# Altium footprint library HW_HOLLAND_NCDM_MONITOR_R1.PcbLib: 472 footprints (part 10 of 30)
Each footprint in its own frame and in the unit in brackets; x right, y up, seen from the top. Pads: shape width x height; smd on the part's side, far side on the other; paste and mask are expansions set on the pad; w line width, h text height; cw(c..) or ccw(c..) is an arc to the next point about the centre after c.
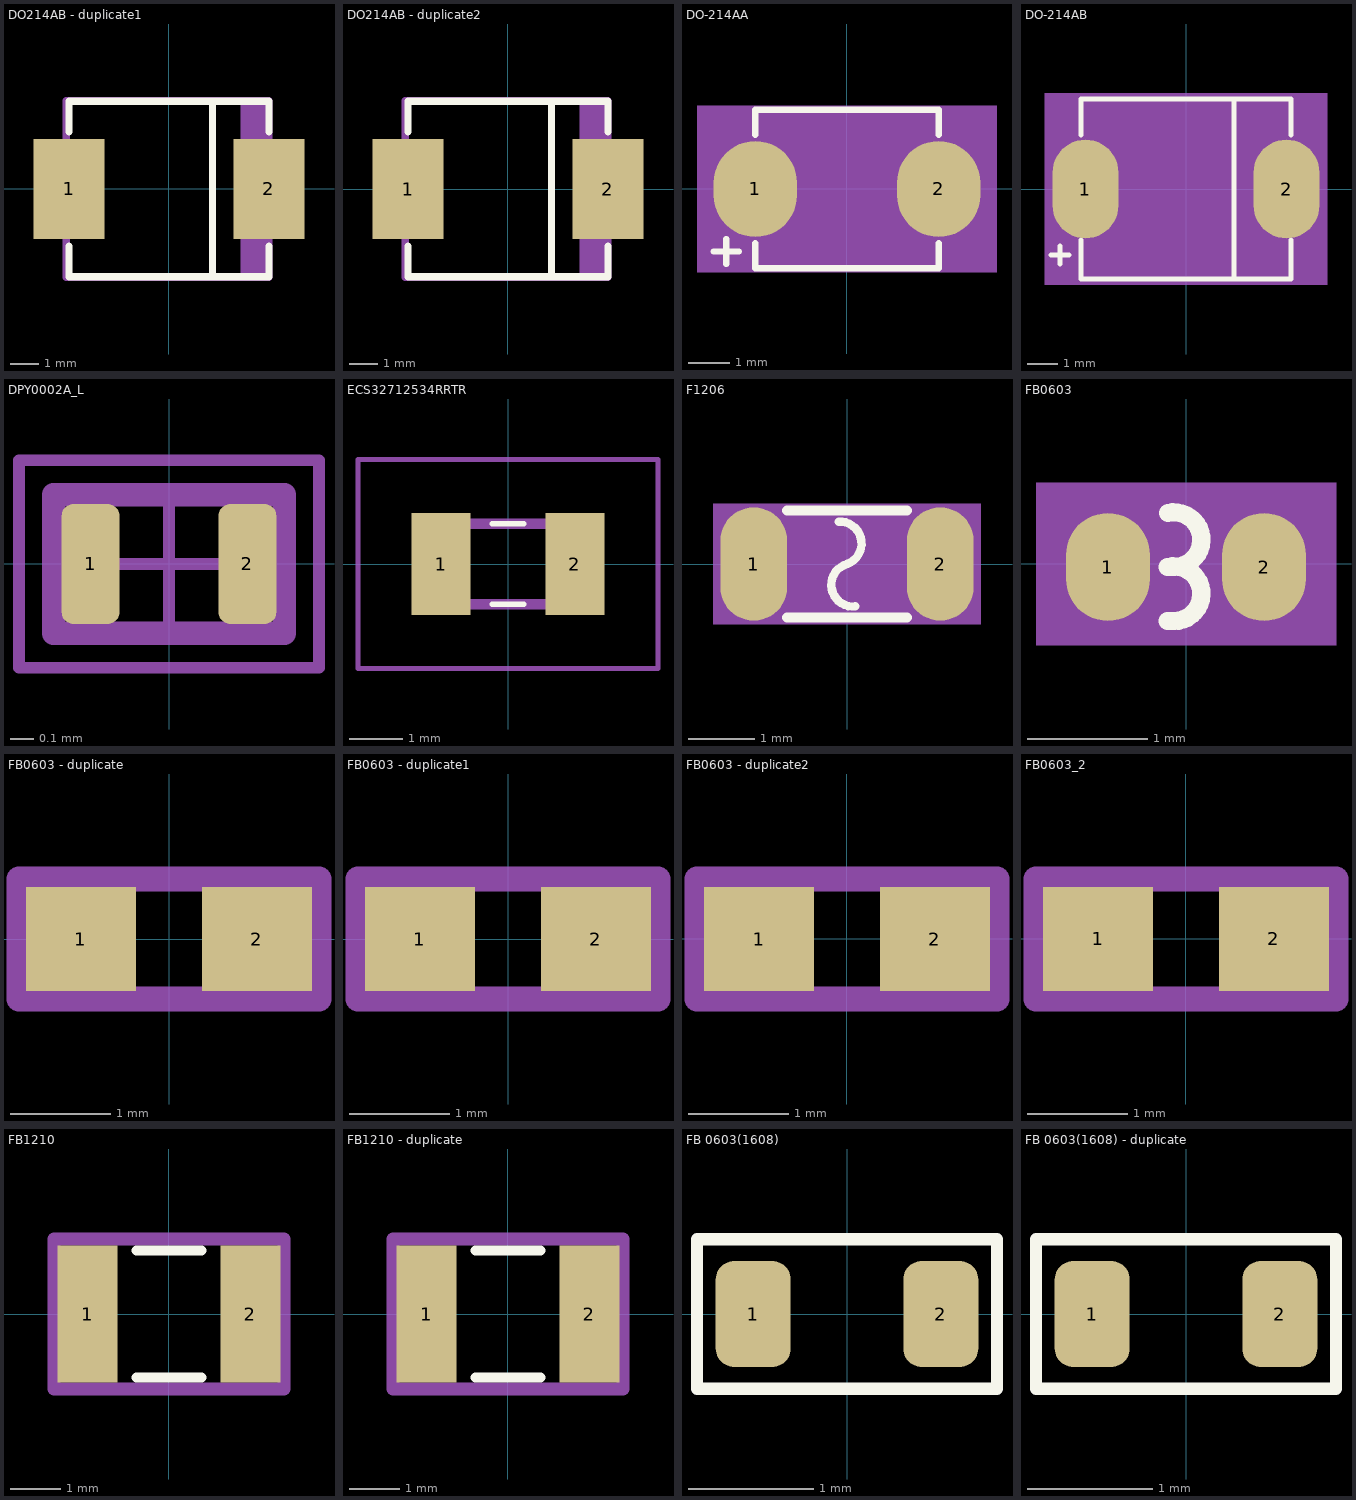
[diagram p9: the footprints below, top view; thin cyan lines are the x and y axes]

## DO214AB - duplicate1 [mm]
pads (2):
  rect 2.5x3.5 smd: 1(-3.5,0) 2(3.5,0)
Top Overlay:
  lines w0.254: -3.5,-3.075 3.5,-3.075 ; -3.5,-3 -3.5,-2 ; -3.5,2 -3.5,3.075 3.5,3.075 3.5,2 ; 1.524,-3 1.524,3 ; 3.5,-3 3.5,-2
Top Designator:
  region: 3.5,3.1 2.5,3.1 2.5,-3.1 3.5,-3.1
  lines w0.254: -3.6,-3.1 -3.6,3.1 3.5,3.1 3.5,-3.1 -3.6,-3.1
  text ".Designator" at -2.812,-0.282 h1.25
3D body "DO-214AB.stp": height 2.65, standoff 0, extent -4.027,-3.125 4.123,3.125

## DO214AB - duplicate2 [mm]
height 0.52
pads (2):
  rect 2.5x3.5 smd: 1(-3.5,0) 2(3.5,0)
Top Overlay:
  lines w0.254: -3.5,-3.075 3.5,-3.075 ; -3.5,-3 -3.5,-2 ; -3.5,2 -3.5,3.075 3.5,3.075 3.5,2 ; 1.524,-3 1.524,3 ; 3.5,-3 3.5,-2
Top Designator:
  region: 3.5,3.101 2.5,3.101 2.5,-3.099 3.5,-3.099
  lines w0.254: -3.6,-3.1 -3.6,3.1 3.5,3.1 3.5,-3.1 -3.6,-3.1
  text ".Designator" at -7.618,-0.508 h1.52
3D body "DO-214AB.stp": height 2.65, standoff 0, extent -4.027,-3.125 4.123,3.125

## DO-214AA [mm]
pads (2):
  oval 2x2.3 smd: 1(-2.2,0) 2(2.2,0)
Top Overlay:
  lines w0.152: -3.2,-1.5 -2.6,-1.5 ; -2.9,-1.8 -2.9,-1.2 ; -2.2,-1.3 -2.2,-1.9 2.2,-1.9 2.2,-1.3 ; -2.2,1.3 -2.2,1.9 2.2,1.9 2.2,1.3
  text ".Designator" at 0.953,0.212 h0.64
Top Assembly:
  lines w0.025: -2.2,-1.9 -2.2,1.9 2.2,1.9 2.2,-1.9 -2.2,-1.9
  lines w0.152: -3.2,-1.5 -2.6,-1.5 ; -2.9,-1.8 -2.9,-1.2
Top 3D Body:
  region: -3.6,2 3.6,2 3.6,-2 -3.6,-2
Mechanical 17:
  text "2" at 2.2,-0.711 h0.89
  text "1" at -2.2,-0.711 h0.89
3D body: height 3.81, standoff 0, extent -3.6,-2 3.6,2

## DO-214AB [mm]
pads (2):
  oval 2.2x3.3 smd: 1(-3.35,0) 2(3.35,0)
Top Overlay:
  lines w0.152: -4.5,-2.2 -3.9,-2.2 ; -4.2,-2.5 -4.2,-1.9 ; -3.5,-1.7 -3.5,-3 3.5,-3 3.5,-1.7 ; -3.5,1.8 -3.5,3 3.5,3 3.5,1.8 ; 1.6,-2.9 1.6,2.9
  text ".Designator" at 0.635,0.211 h0.64
Top Assembly:
  lines w0.025: -3.5,-3 -3.5,3 3.5,3 3.5,-3 -3.5,-3
  lines w0.152: -4.5,-2.2 -3.9,-2.2 ; -4.2,-2.5 -4.2,-1.9
Top 3D Body:
  region: -4.7,3.2 -4.7,-3.2 4.7,-3.2 4.7,3.2
Mechanical 17:
  text "2" at 3.554,-0.1 h0.64
  text "1" at -3.146,-0.1 h0.64
3D body: height 3.81, standoff 0, extent -4.7,-3.2 4.7,3.2

## DPY0002A_L [mm]
height 0.52
pads (2):
  rrect40% 0.25x0.52 smd: 1(-0.34,0) 2(0.34,0)
Mechanical 13:
  lines w0.1: -0.5,-0.3 -0.5,0.3 0.5,0.3 0.5,-0.3 -0.5,-0.3
Mechanical 15:
  lines w0.05: -0.3,0 0.3,0 ; 0,-0.3 0,0.3 ; -0.65,-0.45 -0.65,0.45 0.65,0.45 0.65,-0.45 -0.65,-0.45
3D body: height 0.4, standoff 0, extent -0.5,-0.3 0.5,0.3

## ECS32712534RRTR [mm]
pads (2):
  rect 1.1x1.9 smd: 1(-1.25,0) 2(1.25,0)
Top Overlay:
  lines w0.1: -0.3,-0.75 0.3,-0.75 ; -0.3,0.75 0.3,0.75
Mechanical 13:
  lines w0.2: -1.6,-0.75 1.6,-0.75 1.6,0.75 -1.6,0.75 -1.6,-0.75
Mechanical 15:
  lines w0.1: -2.8,-1.95 2.8,-1.95 2.8,1.95 -2.8,1.95 -2.8,-1.95
3D body "ECS-.327-12.5-34R-TR.STEP": height 0.91, standoff 0.01, extent -1.6,-0.75 1.6,0.75

## F1206 [mm]
pads (2):
  oval 1x1.7 smd: 1(-1.397,0) 2(1.397,0)
Top Overlay:
  lines w0.127: -0.127,0.635 cw(c-0.109,0.308) 0,0 ccw(c0.09,-0.312) 0.127,-0.635
  lines w0.152: -0.9,-0.8 0.9,-0.8 ; -0.9,0.8 0.9,0.8
  text ".Designator" at -0.635,-0.212 h0.64
Top Assembly:
  lines w0.025: -1.6,-0.8 1.6,-0.8 1.6,0.8 -1.6,0.8 -1.6,-0.8
Top 3D Body:
  region: -2,0.9 2,0.9 2,-0.9 -2,-0.9
Mechanical 17:
  text "2" at 1.397,0.356 h0.89
  text "1" at -1.397,0.356 h0.89
3D body: height 3.81, standoff 0, extent -2,-0.9 2,0.9

## FB0603 [mm]
pads (2):
  oval 0.7x0.9 smd: 1(-0.65,-0.025) 2(0.65,-0.025)
Top Overlay:
  lines w0.152: -0.155,-0.475 -0.1,-0.475 ccw(c-0.1,-0.247) -0.15,-0.025 ; -0.155,-0.025 -0.1,-0.025 ccw(c-0.1,0.203) -0.15,0.425
Top Assembly:
  lines w0.025: -0.8,-0.425 0.8,-0.425 0.8,0.375 -0.8,0.375 -0.8,-0.425
Top 3D Body:
  region: -1.25,0.675 1.25,0.675 1.25,-0.675 -1.25,-0.675
Mechanical 17:
  text "1" at -0.142,-0.025 h1.27
  text "2" at 1.158,-0.025 h1.27
3D body: height 3.81, standoff 0, extent -1.25,-0.675 1.25,0.675

## FB0603 - duplicate [mm]
height 3.5
pads (2):
  rect 1.1x1.04 smd: 1(-0.88,0) 2(0.88,0)
Top Designator:
  lines w0.254: -1.5,-0.6 -1.5,0.6 1.5,0.6 1.5,-0.6 -1.5,-0.6
3D body "FB0603.step": height 0.8, standoff 0, extent -0.8,-0.4 0.8,0.4

## FB0603 - duplicate1 [mm]
height 3.5
pads (2):
  rect 1.1x1.04 smd: 1(-0.88,0) 2(0.88,0)
Top Designator:
  lines w0.254: -1.5,-0.6 1.5,-0.6 1.5,0.6 -1.5,0.6 -1.5,-0.6
3D body "FB0603.step": height 0.8, standoff 0, extent -0.8,-0.4 0.8,0.4

## FB0603 - duplicate2 [mm]
height 0.52
pads (2):
  rect 1.1x1.04 smd: 1(-0.88,0) 2(0.88,0)
Top Designator:
  lines w0.254: -1.5,-0.6 1.5,-0.6 1.5,0.6 -1.5,0.6 -1.5,-0.6
  text ".Designator" at -3.809,-0.254 h0.76
3D body "FB0603.step": height 0.8, standoff 0, extent -0.8,-0.4 0.8,0.4

## FB0603_2 [mm]
pads (2):
  rect 1.1x1.04 smd: 1(-0.88,0) 2(0.88,0)
Top Designator:
  lines w0.254: -1.5,-0.6 -1.5,0.6 1.5,0.6 1.5,-0.6 -1.5,-0.6
  text ".Designator" at -3.809,-0.254 h0.76
3D body "FB0603.step": height 0.8, standoff 0, extent -0.8,-0.4 0.8,0.4

## FB1210 [mm]
pads (2):
  rect 1.2x2.74 smd: 1(-1.63,0) 2(1.63,0)
Top Overlay:
  lines w0.2: -0.65,-1.27 0.65,-1.27 ; -0.65,1.27 0.65,1.27
Top Designator:
  lines w0.254: -2.3,-1.5 -1.4,-1.5 2.3,-1.5 2.3,1.5 -2.3,1.5 -2.3,-1.5
  text ".Designator" at -2.812,-0.282 h1.25
3D body "FB1210.step": height 2.8, standoff 0, extent -1.6,-1.25 1.6,1.25

## FB1210 - duplicate [mm]
height 0.52
pads (2):
  rect 1.2x2.74 smd: 1(-1.63,0) 2(1.63,0)
Top Overlay:
  lines w0.2: -0.65,-1.27 0.65,-1.27 ; -0.65,1.27 0.65,1.27
Top Designator:
  lines w0.254: -2.3,-1.5 -1.4,-1.5 2.3,-1.5 2.3,1.5 -2.3,1.5 -2.3,-1.5
  text ".Designator" at -7.618,-0.508 h1.52
3D body "FB1210.step": height 2.8, standoff 0, extent -1.6,-1.25 1.6,1.25

## FB 0603(1608) [mm]
pads (2):
  rrect50% 0.6x0.85 smd: 1(-0.75,0) 2(0.75,0)
Top Overlay:
  lines w0.1: -1.2,-0.6 -1.2,0.6 1.2,0.6 1.2,-0.6 -1.2,-0.6
3D body "FB 0603.STEP": height 0.8, standoff 0, extent -0.8,-0.4 0.8,0.4

## FB 0603(1608) - duplicate [mm]
pads (2):
  rrect50% 0.6x0.85 smd: 1(-0.75,0) 2(0.75,0)
Top Overlay:
  lines w0.1: -1.2,-0.6 -1.2,0.6 1.2,0.6 1.2,-0.6 -1.2,-0.6
3D body "FB 0603.STEP": height 0.8, standoff 0, extent -0.8,-0.4 0.8,0.4